# Altium integrated library Integrated_Library1.IntLib: 305 symbols (part 1 of 2) (continued)
## PLS 1 x 6 (continued)
text: Цепь

## PLS 1 x 9
designator X?
Contact_1: *; Contact_2: *; Contact_3: *; Contact_4: *; Contact_5: *; Contact_6: *; Contact_7: *; Contact_8: *; Contact_9: *; Name: PLS 1 x 9
footprint PLS2-9 - emty
pins: 1, 2, 3, 4, 5, 6, 7, 8, 9
text: Цепь

## PLS 3 x 2
designator X?
Contact_1: MISO; Contact_2: +5В; Contact_3: SCK; Contact_4: MOSI; Contact_5: RESET; Contact_6: GND; Name: PLS 3 x 2
footprint PLS 3 x 2
footprint PLS_2,0 3 x 2 (2)
pins: 1, 2, 3, 4, 5, 6
text: Цепь

## PTH08080W
designator DD?
DC/DC, 2.5А; Name: PTH08080W
footprint PTH08080W
pins: 1 Vi, 2 GND, 3 Vo, 4 VoADJ, 5 ~{INHIBIT}
text: STU

## SK6812
designator VD?
светодиод с пиксельной адресацией SK6812 4020; Name: SK6812
footprint 3535 (sk6812-mini)
pins: 1 VDD, 2 DOUT, 3 DIN, 4 GND

## SMD светодиод
designator VD?, comment Синий светодиод
Светодтод SMD; Name: Синий светодиод
footprint 0603 - led
footprint 0805 - led (Chip Resistor, 2-Leads, Body 2,10x1,30mm, IPC Medium Density)
footprint 0603 - led - no point
pins: 1 A, 2 K

## switch
designator SW?
footprint MK12C02 (переключатель SMD)
pins: 1, 2, 3

## TestPoint
designator TP?  (value not drawn)
footprint 0.5 x 0,9_round
pins: 1

## TP4056
designator DD?
линейное зарядное устройство; Name: TP4056
footprint SOP-8 (SOP127P600X175-8N, SOP, 8-Leads, Body 4,91x3,95mm, Pitch 1,27mm, IPC Medium Density)
pins: 1 TEMP, 2 PROG, 3 GND, 4 VCC, 5 BAT, 6 CHRG, 7 STDBY, 8 CE

## USB4105
designator X?, comment USB Type-C
USB Type-C USB4105-GF-A / GCT; Contact_1: SBU2; Contact_2: CC1; Contact_3: Dn2; Contact_4: Dp1; Contact_5: Dn1; Contact_6: Dp2; Contact_7: SBU1; Contact_8: CC2; Contact_9: VCC; Contact_10: GND; Name: USB Type-C
footprint USB4105-15-A-120 (USB Type-c 16p USB4105-15-A-120)
pins: 1 B8, 2 A5, 3 B7, 4 A6, 5 A7, 6 B6, 7 A8, 8 B5, 9 GND, 10 VCC, TP
text: Цепь; 11

## USB-C
designator X?, comment 16PF-015
Contact_1: VCC; Contact_2: D+; Contact_3: D-; Contact_4: GND; Contact_5: TP; Name: 16PF-015
footprint 16PF-015 (USB-Type C)
pins: 0, 1, 2, 3, 4
text: Цепь; 5

## XT30PW-M
designator X?
Contact_1: PSwitch1; Contact_2: PSwitch2; Name: XT30PW-M
footprint XT30PW-M
pins: 1, 2
text: Цепь

## XT30UPB-M
designator X?
Contact_1: PSwitch1; Contact_2: PSwitch2; Name: XT30UPB-M
footprint XT30UPB-M
pins: 1, 2
text: Цепь

## Индуктивность
designator L?, comment 0.1мк
Value: 0.1мк
footprint SRP1038A (SRP1038A-4R7M)
footprint L0402
footprint L0603 (Chip Inductor, 2-Leads, Body 1,60x0,80mm, IPC Medium Density)
footprint L0805
pins: 1, 2

## Кер. конденсатор
designator С?, comment 0,1мк
Value: 0,1мк
footprint C0603
footprint C1210_AA - 2.5
footprint C0402
pins: 1, 2

## Конденсатор
designator PC?, comment 100мк
Value: 100мк
footprint TR13F (Aluminum Electrolytic Capacitor, Body 6,60x6,60x6,30mm, IPC Low Density)
pins: 1, 2

## Предохранитель
designator FU?, comment 1,5A
Предохранитель 2Вт; Name: CC12H1.5A; Value: 1,5A
footprint F1206 (SMD FUSE 1206)
pins: 1, 2

## Резистор 0.05Вт
designator R?, comment 10к
Резистор 0,05Вт; Value: 10к
footprint R0603
footprint R0402
pins: 1, 2

## Резистор 0.5Вт
designator R?, comment 0
Value: 0
footprint R1210
pins: 1, 2

## Резистор 0.125Вт
designator R?, comment 10к
Резистор  0,125Вт; Value: 10к
footprint 0805 (Chip Resistor, 2-Leads, Body 2,10x1,30mm, IPC Medium Density)
pins: 1, 2

## Резистор 2Вт
designator R?
Резистор 2Вт; Value: *
footprint R2512
pins: 1, 2

## Резисторная сборка 0.05 x 4
designator R?, comment 100
Value: 100
footprint R0603X4
footprint R0402x4
pins: 1, 2, 3, 4, 5, 6, 7, 8

## Термистор
designator RT?, comment 10к
Value: 10к
footprint R1206
pins: 1, 2
text: t°


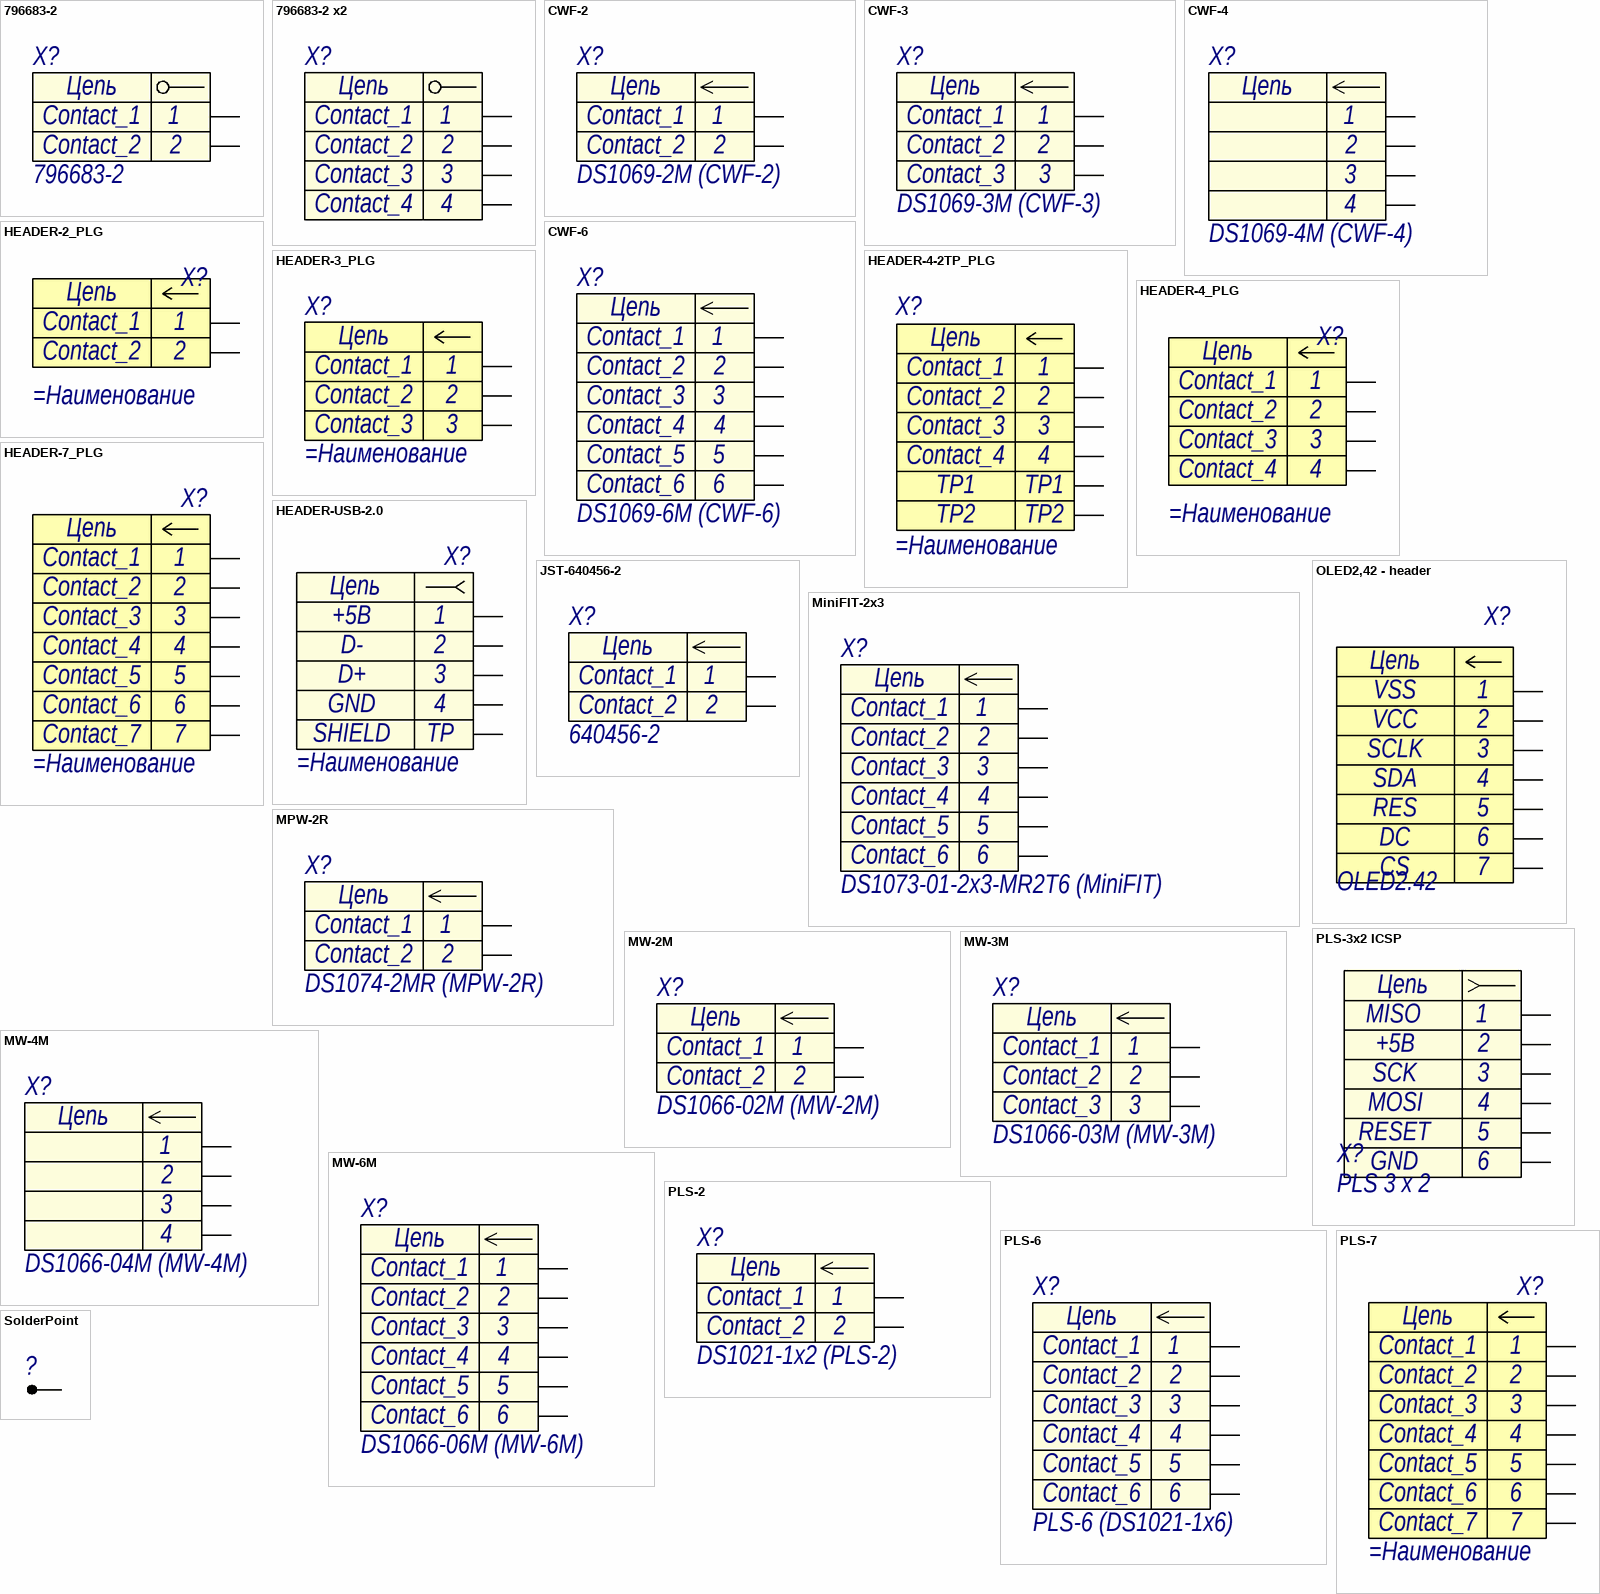
[diagram p7: symbols 796683-2 to SolderPoint]

## 796683-2
designator X?
Винтовой клеммник (наборный 2х2); Contact_1: Contact_1; Contact_2: Contact_2; Name: 796683-2
footprint 796683-2
footprint 796683-2 pad
pins: 1, 2
text: Цепь

## 796683-2 х2
designator X?, comment 796683-2  (value not drawn)
Винтовой клеммник (наборный 2х2); Contact_1: Contact_1; Contact_2: Contact_2; Contact_3: Contact_3; Name: 796683-2; Contact_4: Contact_4
footprint 796683-2*2
pins: 1, 2, 3, 4
text: Цепь

## CWF-2
designator X?, comment DS1069-2M (CWF-2)
Разъем - 2 конт. прямая вилка на плату; Contact_1: Contact_1; Contact_2: Contact_2; Name: DS1069-2M (CWF-2)
footprint CWF-2
pins: 1, 2
text: Цепь

## CWF-3
designator X?, comment DS1069-3M (CWF-3)
Разъем - 3 конт. прямая вилка на плату; Contact_1: Contact_1; Contact_2: Contact_2; Contact_3: Contact_3; Name: DS1069-3M (CWF-3)
footprint CWF-3
pins: 1, 2, 3
text: Цепь

## CWF-4
designator X?, comment DS1069-4M (CWF-4)
Разъем - 4 конт. прямая вилка на плату; Name: DS1069-4M (CWF-4)
footprint CWF-4
pins: 1, 2, 3, 4
text: Цепь

## CWF-6
designator X?, comment DS1069-6M (CWF-6)
Разъем - 6 конт. прямая вилка на плату; Contact_1: Contact_1; Contact_2: Contact_2; Contact_3: Contact_3; Contact_4: Contact_4; Contact_5: Contact_5; Contact_6: Contact_6; Name: DS1069-6M (CWF-6)
footprint CWF-6
pins: 1, 2, 3, 4, 5, 6
text: Цепь

## HEADER-2_PLG
designator X?
Contact_1: Contact_1; Contact_2: Contact_2; ClassName: *
pins: 1, 2
text: Цепь

## HEADER-3_PLG
designator X?
Contact_1: Contact_1; Contact_2: Contact_2; Contact_3: Contact_3; ClassName: *
pins: 1, 2, 3
text: Цепь

## HEADER-4-2TP_PLG
designator X?
ClassName: *; Contact_1: Contact_1; Contact_2: Contact_2; Contact_3: Contact_3; Contact_4: Contact_4
pins: 1, 2, 3, 4, TP1, TP2
text: Цепь

## HEADER-4_PLG
designator X?
Contact_1: Contact_1; Contact_2: Contact_2; Contact_3: Contact_3; Contact_4: Contact_4; ClassName: *
pins: 1, 2, 3, 4
text: Цепь

## HEADER-7_PLG
designator X?
Contact_1: Contact_1; Contact_2: Contact_2; Contact_3: Contact_3; Contact_4: Contact_4; Contact_5: Contact_5; Contact_6: Contact_6; Contact_7: Contact_7; ClassName: *
pins: 1, 2, 3, 4, 5, 6, 7
text: Цепь

## HEADER-USB-2.0
designator X?
Contact_1: +5В; Contact_2: D-; Contact_3: D+; Contact_4: GND
footprint USB-A (Универсальный разъем USB-A для поверхностного и сквохного монтажа)
pins: 1, 2, 3, 4, TP
text: Цепь; SHIELD

## JST-640456-2
designator X?, comment 640456-2
Разъем - 2 конт. прямая вилка на плату; Contact_1: Contact_1; Contact_2: Contact_2; Name: 640456-2
footprint JST-640456-2
pins: 1, 2
text: Цепь

## MiniFIT-2x3
designator X?, comment DS1073-01-2x3-MR2T6 (MiniFIT)
Разъем - 6 конт. угловая вилка на плату(Minifit); Contact_1: Contact_1; Contact_2: Contact_2; Contact_3: Contact_3; Contact_4: Contact_4; Contact_5: Contact_5; Contact_6: Contact_6; Name: DS1073-01-2x3-MR2T6 (MiniFIT)
footprint DS1073-01-2x3-MR2T6
pins: 1, 2, 3, 4, 5, 6
text: Цепь

## MPW-2R
designator X?, comment DS1074-2MR (MPW-2R)
Разъем - 2 конт. угловая вилка на плату MPW-2R; Contact_1: Contact_1; Contact_2: Contact_2; Name: DS1074-2MR (MPW-2R)
pins: 1, 2
text: Цепь

## MW-2M
designator X?, comment DS1066-02M (MW-2M)
Разъем - 2 конт. прямая вилка на плату; Contact_1: Contact_1; Contact_2: Contact_2; Name: DS1066-02M (MW-2M)
footprint MW-2M
pins: 1, 2
text: Цепь

## MW-3M
designator X?, comment DS1066-03M (MW-3M)
Разъем - 3 конт. прямая вилка на плату; Contact_1: Contact_1; Contact_2: Contact_2; Contact_3: Contact_3; Name: DS1066-03M (MW-3M)
footprint MW-3M
pins: 1, 2, 3
text: Цепь

## MW-4M
designator X?, comment DS1066-04M (MW-4M)
Разъем - 4 конт. прямая вилка на плату; Name: DS1066-04M (MW-4M)
pins: 1, 2, 3, 4
text: Цепь

## MW-6M
designator X?, comment DS1066-06M (MW-6M)
Разъем - 6 конт. прямая вилка на плату; Contact_1: Contact_1; Contact_2: Contact_2; Contact_3: Contact_3; Contact_4: Contact_4; Contact_5: Contact_5; Contact_6: Contact_6; Name: DS1066-06M (MW-6M)
footprint MW-6M
pins: 1, 2, 3, 4, 5, 6
text: Цепь

## OLED2,42 - header
designator X?, comment OLED2.42
OLED дисплей 2.42inc - PLS2.54 - 1x7; Contact_1: VSS; Contact_2: VCC; Contact_3: SCLK; Contact_4: SDA; Contact_5: RES; Contact_6: DC; Contact_7: CS; ClassName: *; Наименование: OLED2.42
footprint OLED2.42-PLS2.54-1x7 (OLED 2.42inc, PLS2.54-1x7)
pins: 1, 2, 3, 4, 5, 6, 7
text: Цепь

## PLS-2
designator X?, comment DS1021-1x2 (PLS-2)
Разъем - 2 конт. прямая вилка на плату, шаг 2,54 мм; Contact_1: Contact_1; Contact_2: Contact_2; Name: DS1021-1x2 (PLS-2)
footprint PLS-2
pins: 1, 2
text: Цепь

## PLS-3x2 ICSP
designator X?, comment PLS 3 x 2
Разъем - 6 конт. 2x3, шаг 2,54 мм; Contact_1: MISO; Contact_2: +5В; Contact_3: SCK; Contact_4: MOSI; Contact_5: RESET; Contact_6: GND; Name: PLS 3 x 2
footprint pls-2,54-3x2-tht-v
pins: 1, 2, 3, 4, 5, 6
text: Цепь

## PLS-6
designator X?, comment PLS-6 (DS1021-1x6)
Разъем - 6 конт. прямая вилка на плату, шаг 2,54 мм; Contact_1: Contact_1; Contact_2: Contact_2; Contact_3: Contact_3; Contact_4: Contact_4; Contact_5: Contact_5; Contact_6: Contact_6; Name: PLS-6 (DS1021-1x6)
footprint PLS-6
pins: 1, 2, 3, 4, 5, 6
text: Цепь

## PLS-7
designator X?
Contact_1: Contact_1; Contact_2: Contact_2; Contact_3: Contact_3; Contact_4: Contact_4; Contact_5: Contact_5; Contact_6: Contact_6; Contact_7: Contact_7; ClassName: *
footprint pls-2,54-7-tht-v (PLS-7)
pins: 1, 2, 3, 4, 5, 6, 7
text: Цепь

## SolderPoint
designator ?
Контакт
footprint SOLDER_POINT
pins: 1

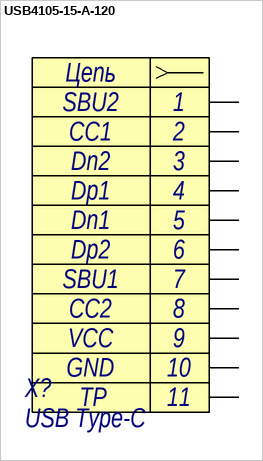
[diagram p8: symbol USB4105-15-A-120]

## USB4105-15-A-120
designator X?, comment USB Type-C
USB Type-C USB4105-GF-A / GCT; Contact_1: SBU2; Contact_2: CC1; Contact_3: Dn2; Contact_4: Dp1; Contact_5: Dn1; Contact_6: Dp2; Contact_7: SBU1; Contact_8: CC2; Contact_9: VCC; Contact_10: GND; Name: USB Type-C
footprint USB4105-15-A-120 (USB Type-c 16p USB4105-15-A-120)
pins: 1 B8, 2 A5, 3 B7, 4 A6, 5 A7, 6 B6, 7 A8, 8 B5, 9 GND, 10 VCC, TP
text: Цепь; 11


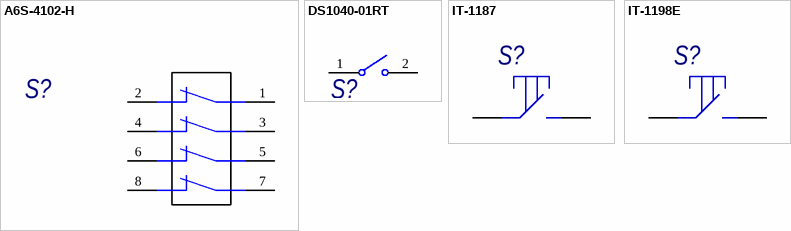
[diagram p9: symbols A6S-4102-H to IT-1198E]

## A6S-4102-H
designator S?
footprint A6S-4102-H
pins: 1, 2, 3, 4, 5, 6, 7, 8

## DS1040-01RT
designator S?  (value not drawn)
DIP переключатель; Name: DS1040-01RT
footprint DS1040-01RN (Footprint not found)
pins: 1, 2

## IT-1187
designator S?  (value not drawn)
тактовая кнопка SMD; Name: IT-1187
footprint it-1187
pins: 1, 2

## IT-1198E
designator S?  (value not drawn)
боковая тактовая кнопка SMD; Name: IT-1198E
footprint IT-1198E
pins: 1, 2


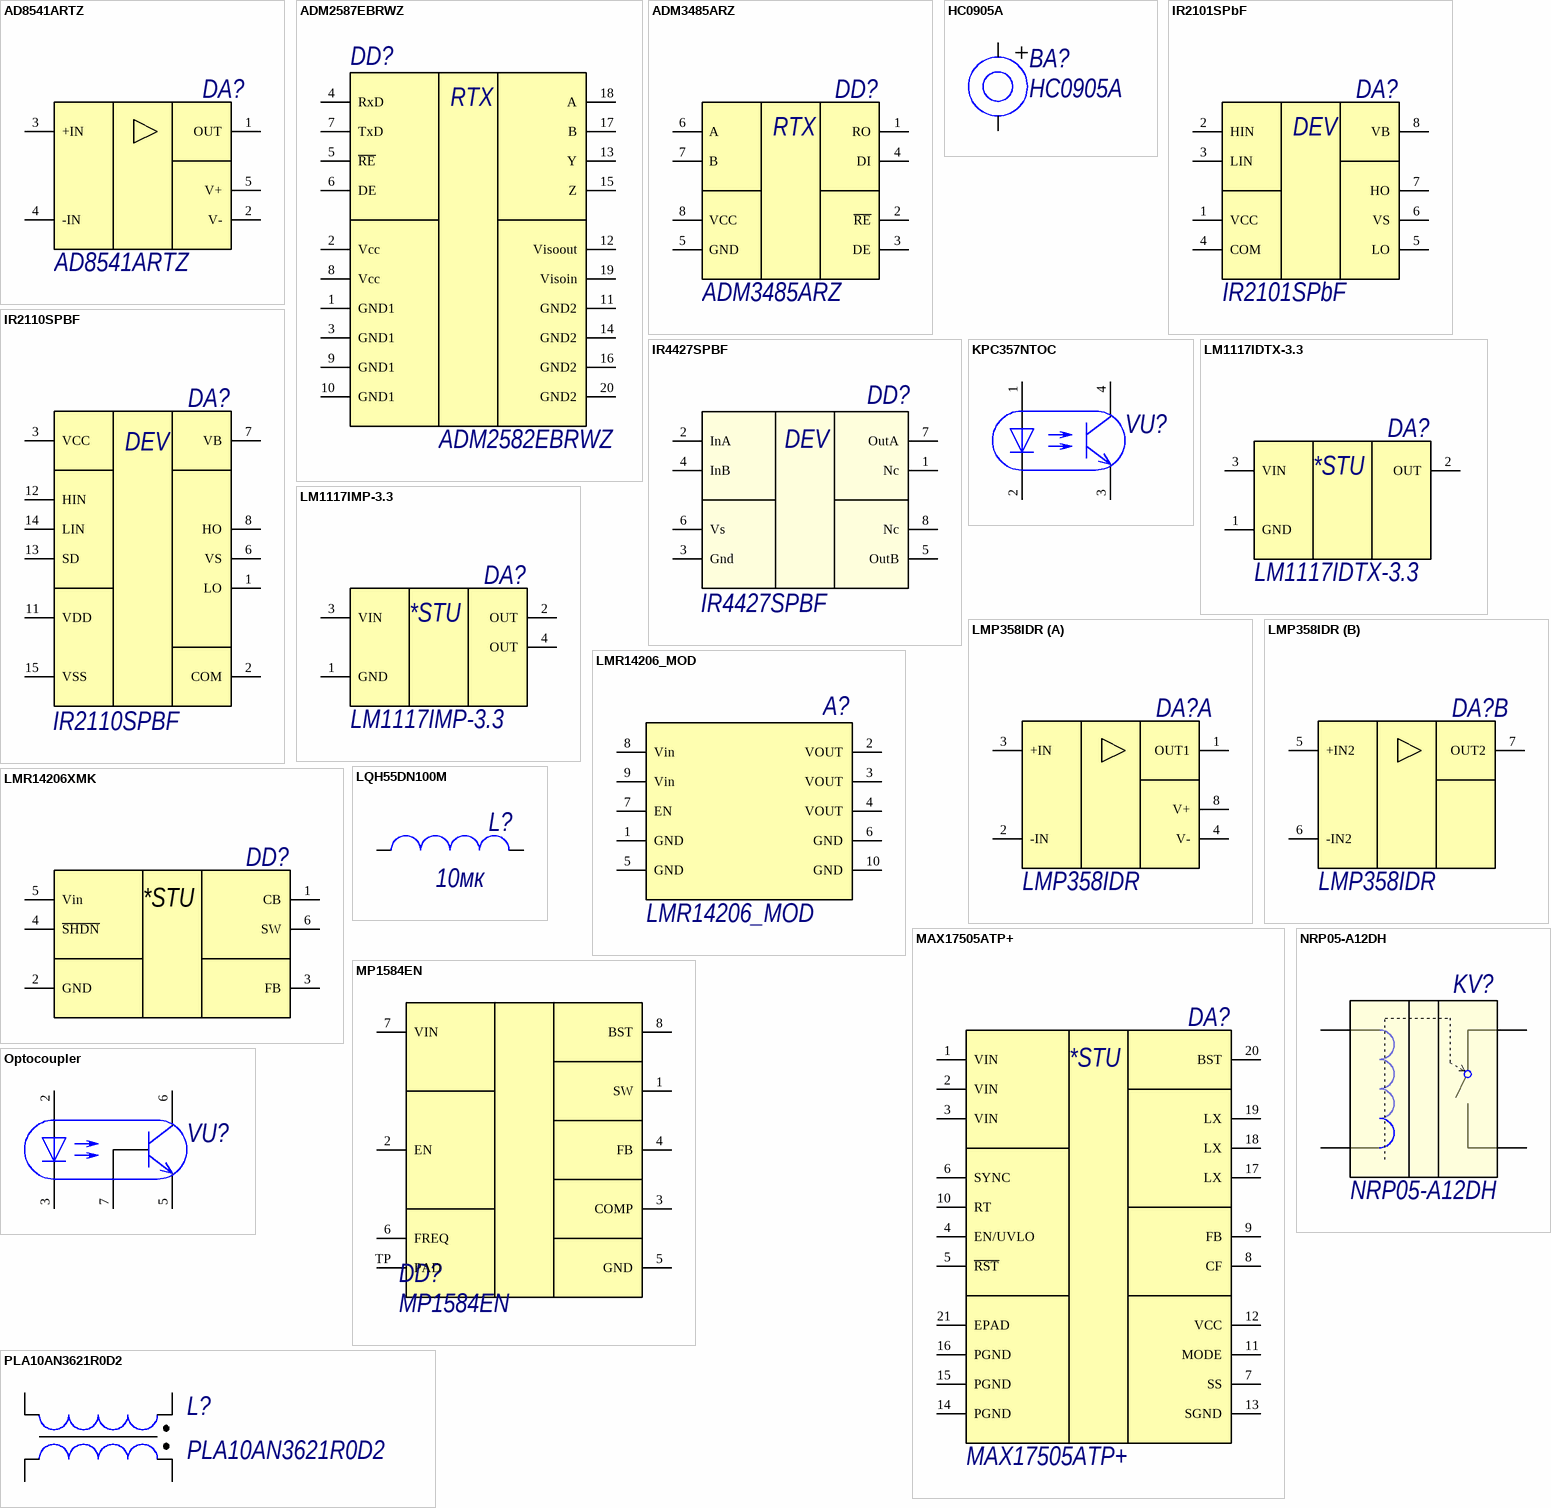
[diagram p10: symbols AD8541ARTZ to PLA10AN3621R0D2]

## AD8541ARTZ
designator DA?
Операционнй усилитель ОУ 2.7-5.5В CMOS Rail-to-rail; Manufacturer: Analog Devices; Name: AD8541ARTZ
footprint SOT23-5
pins: 1 OUT, 2 V-, 3 +IN, 4 -IN, 5 V+

## ADM2587EBRWZ
designator DD?, comment ADM2582EBRWZ
Приемопередатчик RS485 изолированный; Link: *; Name: ADM2582EBRWZ
pins: 1 GND1, 2 Vcc, 3 GND1, 4 RxD, 5 ~{RE}, 6 DE, 7 TxD, 8 Vcc, 9 GND1, 10 GND1, 11 GND2, 12 Visoout, 13 Y, 14 GND2, 15 Z, 16 GND2, 17 B, 18 A, 19 Visoin, 20 GND2
text: RTX

## ADM3485ARZ
designator DD?
Приемопередатчик RS-485 полудуплекс 10(мБит); Manufacturer: Analog Devices; Name: ADM3485ARZ
footprint SO-8 (SOIC, 8-Leads, Body 4,90x3,90mm, Pitch 1,27mm, IPC High Density)
pins: 1 RO, 2 ~{RE}, 3 DE, 4 DI, 5 GND, 6 A, 7 B, 8 VCC
text: RTX

## HC0905A
designator BA?
Излучатель звука; Manufacturer: JL World; Rated voltage: 5В; Rated current: 80мА; Resonant frequency: 3200Гц; Name: HC0905A
footprint HC09A
pins: 1, 2

## IR2101SPbF
designator DA?
Драйвер МОП-транзисторов верхнего и нижнего ключей; Manufacturer: International Rectifier; Name: IR2101SPbF
footprint SO-8 (SOIC, 8-Leads, Body 4,90x3,90mm, Pitch 1,27mm, IPC High Density)
pins: 1 VCC, 2 HIN, 3 LIN, 4 COM, 5 LO, 6 VS, 7 HO, 8 VB
text: DEV

## IR2110SPBF
designator DA?
Драйвер транзисторов MOSFET/IGBT Io = 2(А); Name: IR2110SPBF
footprint SO16W (SOIC, 16-Leads, Body 10,30x7,50mm, Pitch 1,27mm, IPC High Density)
pins: 1 LO, 2 COM, 3 VCC, 6 VS, 7 VB, 8 HO, 11 VDD, 12 HIN, 13 SD, 14 LIN, 15 VSS
text: DEV

## IR4427SPBF
designator DD?
Драйвер ключей нижнего уровня; Name: IR4427SPBF
footprint SO-8 (SOIC, 8-Leads, Body 4,90x3,90mm, Pitch 1,27mm, IPC High Density)
pins: 1 Nc, 2 InA, 3 Gnd, 4 InB, 5 OutB, 6 Vs, 7 OutA, 8 Nc
text: DEV

## KPC357NTOC
designator VU?  (value not drawn)
Оптопара транзисторная; Manufacturer: Cosmo Electronics; Name: KPC357NTOC
footprint SOP-4 (SOP, 4-Leads, Body 3,90x4,40mm, Pitch 2,54mm, IPC High Density)
pins: 1 A, 2 K, 3 E, 4 C

## LM1117IDTX-3.3
designator DA?
Линейный стабилизатор напряжения 3,3В; Manufacturer: Texas Instruments; Name: LM1117IDTX-3.3
footprint D-PAK (D-PAK, 3-Pads, Body 6,21x6,73mm (max), IPC High Density)
pins: 1 GND, 2 OUT, 3 VIN
text: *STU

## LM1117IMP-3.3
designator DA?
Линейный стабилизатор напряжения 3,3В; Manufacturer: Texas Instruments; Name: LM1117IMP-3.3
pins: 1 GND, 2 OUT, 3 VIN, 4 OUT
text: *STU

## LMP358IDR
designator DA?
Сдвоенный операционнй усилитель; Manufacturer: TI; Name: LMP358IDR
footprint SOIC-8 (LMV358)
part A pins: 1 OUT1, 2 -IN, 3 +IN, 4 V-, 8 V+
part B pins: 5 +IN2, 6 -IN2, 7 OUT2

## LMR14206_MOD
designator A?
Импульсный DC/DC
pins: 1 GND, 2 VOUT, 3 VOUT, 4 VOUT, 5 GND, 6 GND, 7 EN, 8 Vin, 9 Vin, 10 GND

## LMR14206XMK
designator DD?  (value not drawn)
Понижающий DC/DC преобразователь Uвх=42В, Iвых=0,6А; Manufacturer: Texas Instruments; Name: LMR14206XMK
pins: 1 CB, 2 GND, 3 FB, 4 ~{SHDN}, 5 Vin, 6 SW
text: *STU

## LQH55DN100M
designator L?  value 10мк  (hidden comment: LQH55DN100M)
Катушка индуктивности; Name: LQH55DN100M; I saturation: *
pins: 1 3, 2 4

## MAX17505ATP+
designator DA?
Понижающий DC/DC с широким диапазоном входых напряжений; Manufacturer: Maxim Integrated; Name: MAX17505ATP+
pins: 1 VIN, 2 VIN, 3 VIN, 4 EN/UVLO, 5 ~{RST}, 6 SYNC, 7 SS, 8 CF, 9 FB, 10 RT, 11 MODE, 12 VCC, 13 SGND, 14 PGND, 15 PGND, 16 PGND, 17 LX, 18 LX, 19 LX, 20 BST, 21 EPAD
text: *STU

## MP1584EN
designator DD?
регулируемый стабилизатор напряжения; Name: MP1584EN
footprint SOIC-8 with PAD
pins: 1 SW, 2 EN, 3 COMP, 4 FB, 5 GND, 6 FREQ, 7 VIN, 8 BST, TP PAD

## NRP05-A12DH
designator KV?
Реле электромеханическое нормальноразомкнутое одноканальное; Manufacturer: NCR Industrial & Electrical Components; Nom. operate voltage: 12В; Max. operate voltage: 15,6В; Coil resistance: 720Ом; Pull-in voltage: 9В; Drop-out voltage: 0,6В; Max. contact resistance: 50мОм; Max. operation time: 10мс; Max. voltage; DC: 30В; Max. voltage; AC: 265В; Max. current; DC: 5А; Nom. coil power: 0,2Вт; Max. release time: 4мс; Name: NRP05-A12DH
footprint NRP05-A12DH
pins: 1, 2, 3, 4

## Optocoupler
designator VU?, comment -  (value not drawn)
Оптопара транзисторная DIP-8; Manufacturer: -; TU: -; Name: -
footprint DIP-8
pins: 2, 3, 5, 6, 7

## PLA10AN3621R0D2
designator L?
Синфазный дроссель; Manufacturer: Epcos TDK; Current: 1А; Inductance: 3,6мГн; Name: PLA10AN3621R0D2
footprint PLA10 (синфазный дроссель murata)
pins: 1, 2, 3, 4

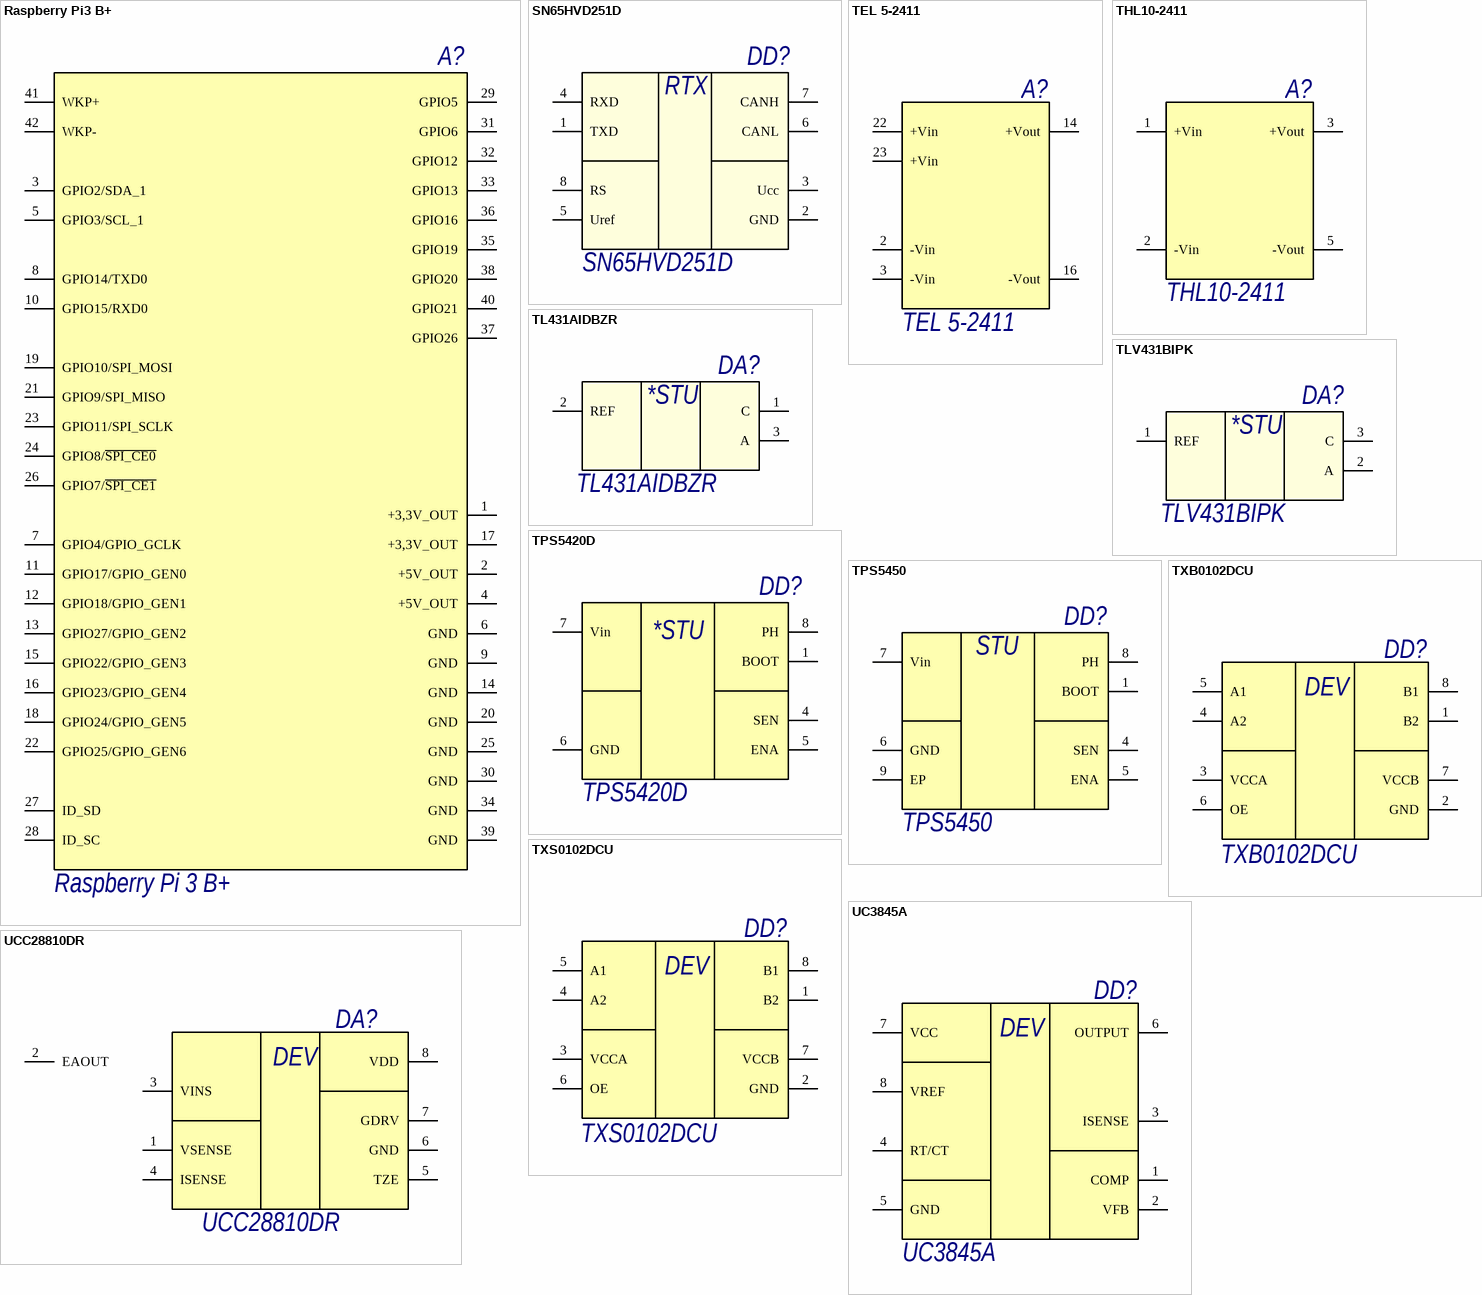
[diagram p11: symbols Raspberry Pi3 B+ to UCC28810DR]

## Raspberry Pi3 B+
designator A?  Name: Raspberry Pi 3 B+  (hidden comment: Raspberry Pi3 B+)
footprint RASPBERRY_PI_3
pins: 1 +3,3V_OUT, 2 +5V_OUT, 3 GPIO2/SDA_1, 4 +5V_OUT, 5 GPIO3/SCL_1, 6 GND, 7 GPIO4/GPIO_GCLK, 8 GPIO14/TXD0, 9 GND, 10 GPIO15/RXD0, 11 GPIO17/GPIO_GEN0, 12 GPIO18/GPIO_GEN1, 13 GPIO27/GPIO_GEN2, 14 GND, 15 GPIO22/GPIO_GEN3, 16 GPIO23/GPIO_GEN4, 17 +3,3V_OUT, 18 GPIO24/GPIO_GEN5, 19 GPIO10/SPI_MOSI, 20 GND, 21 GPIO9/SPI_MISO, 22 GPIO25/GPIO_GEN6, 23 GPIO11/SPI_SCLK, 24 GPIO8/~{SPI_CE0}, 25 GND, 26 GPIO7/~{SPI_CE1}, 27 ID_SD, 28 ID_SC, 29 GPIO5, 30 GND, 31 GPIO6, 32 GPIO12, 33 GPIO13, 34 GND, 35 GPIO19, 36 GPIO16, 37 GPIO26, 38 GPIO20, 39 GND, 40 GPIO21, 41 WKP+, 42 WKP-

## SN65HVD251D
designator DD?
Приемопередатчик CAN; Name: SN65HVD251D
footprint SO-8 (Footprint not found)
pins: 1 TXD, 2 GND, 3 Ucc, 4 RXD, 5 Uref, 6 CANL, 7 CANH, 8 RS
text: RTX

## TEL 5-2411
designator A?
DC/DC конвертор Uвх = 18 ... 36 (В), Uвых = 5;; Name: TEL 5-2411; Link: https://www.terraelectronica.ru/catalog.php?ID=1430&search=tel%2052411
footprint TEL 5-2411
pins: 2 -Vin, 3 -Vin, 14 +Vout, 16 -Vout, 22 +Vin, 23 +Vin

## THL10-2411
designator A?
DC/DC конвертор Uвх = 18 ... 36 (В), 10(Вт) Uвых = 5,1;; Name: THL10-2411
footprint THL10-2411
pins: 1 +Vin, 2 -Vin, 3 +Vout, 5 -Vout

## TL431AIDBZR
designator DA?
Линейный стабилизатор настраиваемый; Name: TL431AIDBZR
footprint SOT23-3 (SOT23, 3-Leads, Body 2,90x2,30mm, Pitch 0,95mm, IPC Medium Density)
pins: 1 C, 2 REF, 3 A
text: *STU

## TLV431BIPK
designator DA?
Линейный стабилизатор настраиваемый; Name: TLV431BIPK
footprint SOT23-3 (SOT23, 3-Leads, Body 2,90x2,30mm, Pitch 0,95mm, IPC Medium Density)
pins: 1 REF, 2 A, 3 C
text: *STU

## TPS5420D
designator DD?
DC/DC преобразователь; name: TPS5420D
footprint SO-8 (SOIC, 8-Leads, Body 4,90x3,90mm, Pitch 1,27mm, IPC High Density)
pins: 1 BOOT, 4 SEN, 5 ENA, 6 GND, 7 Vin, 8 PH
text: *STU

## TPS5450
designator DD?, comment name  (value not drawn)
DC/DC преобразователь; name: TPS5450
footprint SO-8PP (SOIC, 8-Leads, Body 4,90x3,90mm, Pitch 1,27mm, IPC High Density)
pins: 1 BOOT, 4 SEN, 5 ENA, 6 GND, 7 Vin, 8 PH, 9 EP
text: STU

## TXB0102DCU
designator DD?
Шинный формирователь 2-х канальный; Manufacturer: Texas Instruments; Name: TXB0102DCU
footprint VSSOP-8
pins: 1 B2, 2 GND, 3 VCCA, 4 A2, 5 A1, 6 OE, 7 VCCB, 8 B1
text: DEV

## TXS0102DCU
designator DD?
Шинный формирователь 2-х канальный (открытый сток); Manufacturer: Texas Instruments; Name: TXS0102DCU
footprint VSSOP-8
pins: 1 B2, 2 GND, 3 VCCA, 4 A2, 5 A1, 6 OE, 7 VCCB, 8 B1
text: DEV

## UC3845A
designator DD?
ШИМ-контроллер; Manufacturer: Texas Instruments; Name: UC3845A
footprint SO-8 (SOIC, 8-Leads, Body 4,90x3,90mm, Pitch 1,27mm, IPC High Density)
pins: 1 COMP, 2 VFB, 3 ISENSE, 4 RT/CT, 5 GND, 6 OUTPUT, 7 VCC, 8 VREF
text: DEV

## UCC28810DR
designator DA?
Контроллер питания светодиодного освещения; Manufacturer: Texas Instruments; Name: UCC28810DR
footprint SO-8 (SOIC, 8-Leads, Body 4,90x3,90mm, Pitch 1,27mm, IPC High Density)
pins: 1 VSENSE, 2 EAOUT, 3 VINS, 4 ISENSE, 5 TZE, 6 GND, 7 GDRV, 8 VDD
text: DEV


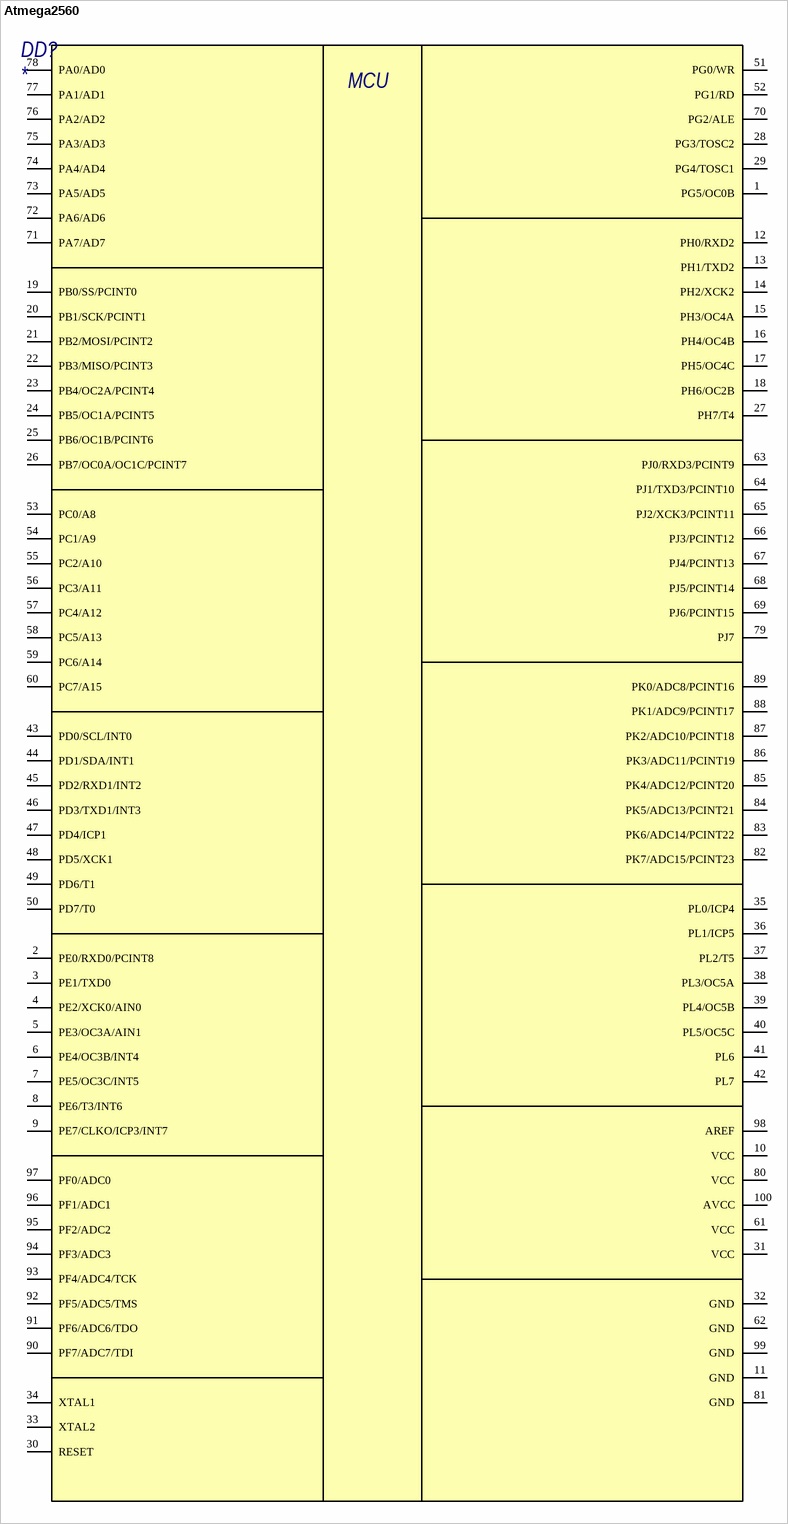
[diagram p12: symbol Atmega2560]

## Atmega2560
designator DD?
footprint LQFP-100_P50_1390X1390X160 (LQFP-100, Body 14,00x14,00mm, Pitch 0,50mm)
pins: 1 PG5/OC0B, 2 PE0/RXD0/PCINT8, 3 PE1/TXD0, 4 PE2/XCK0/AIN0, 5 PE3/OC3A/AIN1, 6 PE4/OC3B/INT4, 7 PE5/OC3C/INT5, 8 PE6/T3/INT6, 9 PE7/CLKO/ICP3/INT7, 10 VCC, 11 GND, 12 PH0/RXD2, 13 PH1/TXD2, 14 PH2/XCK2, 15 PH3/OC4A, 16 PH4/OC4B, 17 PH5/OC4C, 18 PH6/OC2B, 19 PB0/SS/PCINT0, 20 PB1/SCK/PCINT1, 21 PB2/MOSI/PCINT2, 22 PB3/MISO/PCINT3, 23 PB4/OC2A/PCINT4, 24 PB5/OC1A/PCINT5, 25 PB6/OC1B/PCINT6, 26 PB7/OC0A/OC1C/PCINT7, 27 PH7/T4, 28 PG3/TOSC2, 29 PG4/TOSC1, 30 RESET, 31 VCC, 32 GND, 33 XTAL2, 34 XTAL1, 35 PL0/ICP4, 36 PL1/ICP5, 37 PL2/T5, 38 PL3/OC5A, 39 PL4/OC5B, 40 PL5/OC5C, 41 PL6, 42 PL7, 43 PD0/SCL/INT0, 44 PD1/SDA/INT1, 45 PD2/RXD1/INT2, 46 PD3/TXD1/INT3, 47 PD4/ICP1, 48 PD5/XCK1, 49 PD6/T1, 50 PD7/T0, 51 PG0/WR, 52 PG1/RD, 53 PC0/A8, 54 PC1/A9, 55 PC2/A10, 56 PC3/A11, 57 PC4/A12, 58 PC5/A13, 59 PC6/A14, 60 PC7/A15, 61 VCC, 62 GND, 63 PJ0/RXD3/PCINT9, 64 PJ1/TXD3/PCINT10, 65 PJ2/XCK3/PCINT11, 66 PJ3/PCINT12, 67 PJ4/PCINT13, 68 PJ5/PCINT14, 69 PJ6/PCINT15, 70 PG2/ALE, 71 PA7/AD7, 72 PA6/AD6, 73 PA5/AD5, 74 PA4/AD4, 75 PA3/AD3, 76 PA2/AD2, 77 PA1/AD1, 78 PA0/AD0, 79 PJ7, 80 VCC, 81 GND, 82 PK7/ADC15/PCINT23, 83 PK6/ADC14/PCINT22, 84 PK5/ADC13/PCINT21, 85 PK4/ADC12/PCINT20, 86 PK3/ADC11/PCINT19, 87 PK2/ADC10/PCINT18, 88 PK1/ADC9/PCINT17, 89 PK0/ADC8/PCINT16, 90 PF7/ADC7/TDI, 91 PF6/ADC6/TDO, 92 PF5/ADC5/TMS, 93 PF4/ADC4/TCK, 94 PF3/ADC3, 95 PF2/ADC2, 96 PF1/ADC1, 97 PF0/ADC0, 98 AREF, 99 GND, 100 AVCC
text: MCU


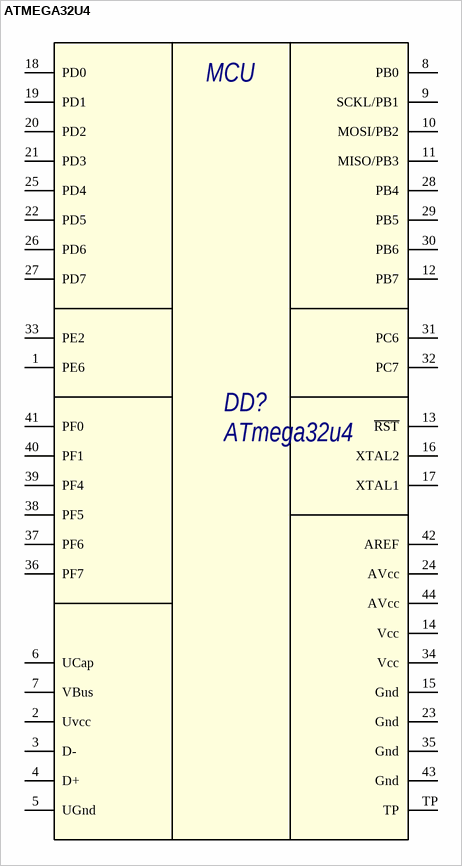
[diagram p13: symbol ATMEGA32U4]

## ATMEGA32U4
designator DD?, comment ATmega32u4
Микроконтроллер AVR 8-bit; Name: ATmega32u4; HelpURL: https://files.amperka.ru/datasheets/ATMega32u4.pdf
footprint TQFP44
footprint QFN44
footprint UNIVERSAL_ATMEGA32U4
pins: 1 PE6, 2 Uvcc, 3 D-, 4 D+, 5 UGnd, 6 UCap, 7 VBus, 8 PB0, 9 SCKL/PB1, 10 MOSI/PB2, 11 MISO/PB3, 12 PB7, 13 ~{RST}, 14 Vcc, 15 Gnd, 16 XTAL2, 17 XTAL1, 18 PD0, 19 PD1, 20 PD2, 21 PD3, 22 PD5, 23 Gnd, 24 AVcc, 25 PD4, 26 PD6, 27 PD7, 28 PB4, 29 PB5, 30 PB6, 31 PC6, 32 PC7, 33 PE2, 34 Vcc, 35 Gnd, 36 PF7, 37 PF6, 38 PF5, 39 PF4, 40 PF1, 41 PF0, 42 AREF, 43 Gnd, 44 AVcc, TP
text: MCU

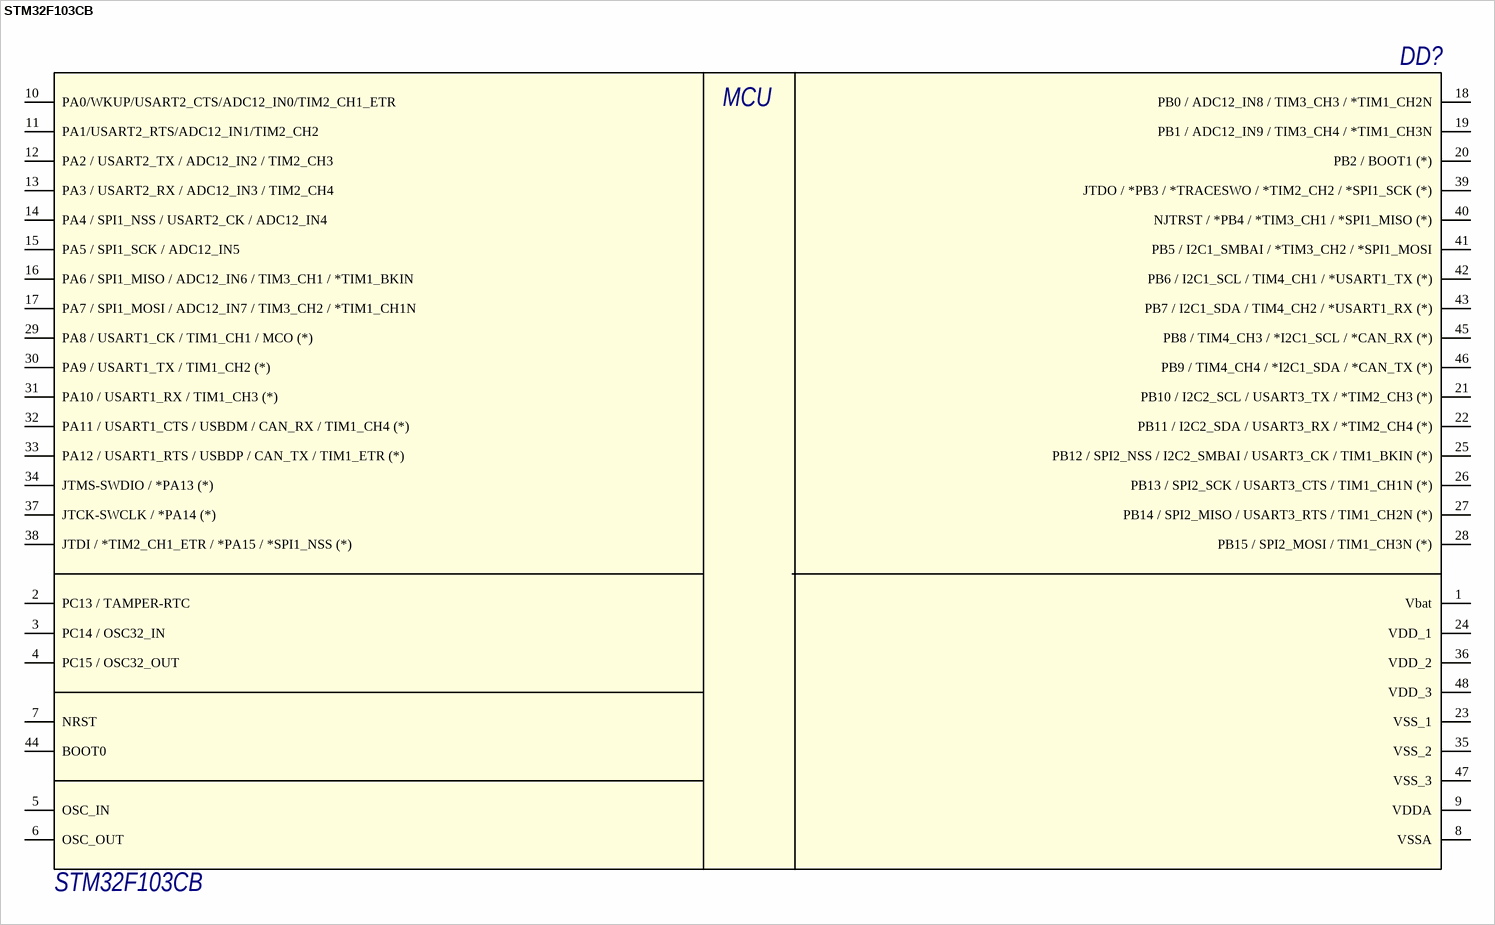
[diagram p14: symbol STM32F103CB]

## STM32F103CB
designator DD?
Микроконтроллер; Name: STM32F103CB
footprint LQFP48 (Thin QFP, 48-Leads, Body 7x7mm, Pitch 0.5mm, IPC High Density)
pins: 1 Vbat, 2 PC13 / TAMPER-RTC, 3 PC14 / OSC32_IN, 4 PC15 / OSC32_OUT, 5 OSC_IN, 6 OSC_OUT, 7 NRST, 8 VSSA, 9 VDDA, 10 PA0/WKUP/USART2_CTS/ADC12_IN0/TIM2_CH1_ETR, 11 PA1/USART2_RTS/ADC12_IN1/TIM2_CH2, 12 PA2 / USART2_TX / ADC12_IN2 / TIM2_CH3, 13 PA3 / USART2_RX / ADC12_IN3 / TIM2_CH4, 14 PA4 / SPI1_NSS / USART2_CK / ADC12_IN4, 15 PA5 / SPI1_SCK / ADC12_IN5, 16 PA6 / SPI1_MISO / ADC12_IN6 / TIM3_CH1 / *TIM1_BKIN, 17 PA7 / SPI1_MOSI / ADC12_IN7 / TIM3_CH2 / *TIM1_CH1N, 18 PB0 / ADC12_IN8 / TIM3_CH3 / *TIM1_CH2N, 19 PB1 / ADC12_IN9 / TIM3_CH4 / *TIM1_CH3N, 20 PB2 / BOOT1 (*), 21 PB10 / I2C2_SCL / USART3_TX / *TIM2_CH3 (*), 22 PB11 / I2C2_SDA / USART3_RX / *TIM2_CH4 (*), 23 VSS_1, 24 VDD_1, 25 PB12 / SPI2_NSS / I2C2_SMBAI / USART3_CK / TIM1_BKIN (*), 26 PB13 / SPI2_SCK / USART3_CTS / TIM1_CH1N (*), 27 PB14 / SPI2_MISO / USART3_RTS / TIM1_CH2N (*), 28 PB15 / SPI2_MOSI / TIM1_CH3N (*), 29 PA8 / USART1_CK / TIM1_CH1 / MCO (*), 30 PA9 / USART1_TX / TIM1_CH2 (*), 31 PA10 / USART1_RX / TIM1_CH3 (*), 32 PA11 / USART1_CTS / USBDM / CAN_RX / TIM1_CH4 (*), 33 PA12 / USART1_RTS / USBDP / CAN_TX / TIM1_ETR (*), 34 JTMS-SWDIO / *PA13 (*), 35 VSS_2, 36 VDD_2, 37 JTCK-SWCLK / *PA14 (*), 38 JTDI / *TIM2_CH1_ETR / *PA15 / *SPI1_NSS (*), 39 JTDO / *PB3 / *TRACESWO / *TIM2_CH2 / *SPI1_SCK (*), 40 NJTRST / *PB4 / *TIM3_CH1 / *SPI1_MISO (*), 41 PB5 / I2C1_SMBAI / *TIM3_CH2 / *SPI1_MOSI, 42 PB6 / I2C1_SCL / TIM4_CH1 / *USART1_TX (*), 43 PB7 / I2C1_SDA / TIM4_CH2 / *USART1_RX (*), 44 BOOT0, 45 PB8 / TIM4_CH3 / *I2C1_SCL / *CAN_RX (*), 46 PB9 / TIM4_CH4 / *I2C1_SDA / *CAN_TX (*), 47 VSS_3, 48 VDD_3